# Altium schematic symbol library 13-Analog D 数模模数.SchLib: 573 symbols (part 1 of 6) (continued)
## AD5622
designator IC?
2.7 V to 5.5 V, <100 µA, 12-Bit nanoDAC, With I2C®-Compatible Interface
pins: 1 ADDR (in), 2 SCL (in), 3 SDA (in), 4 VDD (power), 5 GND (power), 6 VOUT (out)

## AD5627R
designator IC?
Dual, 12-/14-/16-Bit nanoDACs® with 5 ppm/°C On-Chip Reference, I2C Interface
pins: 1 VOUTA (out), 2 VOUTB (power), 3 GND (power), 4 ~{LDAC} (in), 5 ~{CLR} (in), 6 ADDR (in), 7 SCL (io), 8 SDA (io), 9 VDD (power), 10 VREFIN/VREFOUT (io)
text: VREFIN; VREFOUT

## AD5641
designator IC?
2.7 V to 5.5 V, <100 µA, 14-Bit nanoDAC, SPI Interface
pins: 1 ~{SYNC} (in), 2 SCLK (in), 3 SDIN (in), 4 VDD (power), 5 GND (power), 6 VOUT (out)

## AD5662
designator IC?
2.7V to 5.5V, 250uA, Rail-to-Rail Output 16-Bit nanoDAC
pins: 1 VDD (power), 2 VREF (in), 3 VFB (in), 4 VOUT (out), 5 ~{SYNC} (in), 6 SCLK (in), 7 DIN (in), 8 GND (power)

## AD5666
designator IC?
Quad, 16-Bit DAC with 5 ppm/°C On-Chip Reference
pins: 1 ~{LDAC} (in), 2 ~{SYNC} (in), 3 VDD (power), 4 VOUTA (out), 5 VOUTC (out), 6 POR (in), 7 VREFIN/VREFOUT (io), 8 SDO (out), 9 ~{CLR} (in), 10 VOUTD (out), 11 VOUTB (out), 12 GND (power), 13 DIN (in), 14 SCLK (in)
text: VREFIN; VREFOUT

## AD5754R
designator IC?
Complete, Quad, 16-Bit Serial Input Unipolar/Bipolar Voltage Outputs DAC
pins: 1 AVSS (power), 2 NC, 3 VOUTA (out), 4 VOUTB (out), 5 BIN/~{2SCOMP} (in), 6 NC, 7 ~{SYNC} (in), 8 SCLK (in), 9 SDIN (in), 10 ~{LDAC} (in), 11 ~{CLR} (in), 12 NC, 13 NC, 14 DVCC (power), 15 GND (power), 16 SDO (out), 17 REFIN/REFOUT (io), 18 DAC_GND (power), 19 DAC_GND (power), 20 SIG_GND (power), 21 SIG_GND (power), 22 VOUTD (out), 23 VOUTC (out), 24 AVDD (power), 25 EP (power)
text: VREFIN/; VREFOUT

## AD5764R
designator IC?
Complete Quad, 16-Bit, High Accuracy, Serial Input, Bipolar Voltage Output DAC
pins: 1 ~{SYNC} (in), 2 SCLK (in), 3 SDIN (in), 4 SDO (out), 5 ~{CLR} (in), 6 ~{LDAC} (in), 7 D0 (io), 8 D1 (io), 9 ~{RSROUT} (out), 10 ~{RSTIN} (in), 11 DGND (power), 12 DVCC (power), 13 AVDD (power), 14 PGND (power), 15 AVSS (power), 16 ISCC (power), 17 AGNDD (power), 18 VOUTD (out), 19 VOUTC (out), 20 AGNDC (power), 21 AGNDB (power), 22 VOUTB (out), 23 VOUTA (out), 24 AGNDA (power), 25 REFAB (in), 26 REFCD (in), 27 REFOUT (out), 28 REFGND (in), 29 TEMP (out), 30 AVSS (power), 31 AVDD (power), 32 BIN/~{2sCOMP} (power)

## AD5780
designator IC?
System Ready, 18-Bit ±1 LSB INL, Voltage Output DAC
pins: 1 VOUT (out), 2 VREFP (in), 3 VDD (power), 4 ~{RESET} (in), 5 VDD (power), 6 ~{CLR} (in), 7 ~{LDAC} (in), 8 VCC (power), 9 IOVCC (power), 10 DNC, 11 SDO (out), 12 SDIN (in), 13 SCLK (in), 14 ~{SYNC} (in), 15 DGND (power), 16 VREFN (in), 17 VSS (power), 18 VSS (power), 19 AGND (power), 20 RFB (in), 21 DNC, 22 DNC, 23 DNC, 24 INV (out), 25 EP (power)

## AD5791
designator IC?
1 ppm 20-Bit, ±1 LSB INL, Voltage Output DAC
pins: 1 INV (out), 2 VOUT (out), 3 VREFPS (out), 4 VREFPF (in), 5 VDD (power), 6 ~{RESET} (in), 7 ~{CLR} (in), 8 ~{LDAC} (in), 9 VCC (power), 10 IOVCC (power), 11 SDO (out), 12 SDIN (in), 13 SCLK (in), 14 ~{SYNC} (in), 15 DGND (in), 16 VREFNF (in), 17 VREFNS (out), 18 VSS (in), 19 AGND (power), 20 RFB (in)

## AD7194
designator IC?
8-Channel, 4.8 kHz, Ultralow Noise, 24-Bit Sigma-Delta ADC with PGA
pins: 1 AIN1/P3 (io), 2 AIN2/P2 (io), 3 AIN3/P1/REFIN2(+) (io), 4 AIN4/P0/REFIN2(-) (io), 5 AINCOM (power), 6 AGND (power), 7 AIN5 (in), 8 AIN6 (in), 9 AIN7 (in), 10 AIN8 (in), 11 AIN9 (in), 12 AIN10 (in), 13 AIN11 (in), 14 AIN12 (in), 15 AIN13 (in), 16 AIN14 (in), 17 REFIN1(+) (in), 18 REFIN1(-) (in), 19 AIN15 (in), 20 AIN16 (in), 21 AGND (power), 22 DGND (power), 23 AVDD (power), 24 DVDD (power), 25 ~{SYNC} (in), 26 NC, 27 DOUT/~{RDY} (out), 28 DIN (in), 29 MCLK1 (in), 30 MCLK2 (in), 31 SCLK (in), 32 ~{CS} (in), 33 EP (in)

## AD7224KN
designator IC?
LC2MOS 8-Bit DAC with Output Amplifiers
pins: 1 VSS (power), 2 VOUT (out), 3 VREF (in), 4 AGND (power), 5 DGND (power), 6 DB7 (in), 7 DB6 (in), 8 DB5 (in), 9 DB4 (in), 10 DB3 (in), 11 DB2 (in), 12 DB1 (in), 13 DB0 (in), 14 ~{CS} (in), 15 ~{WR} (in), 16 ~{LDAC} (in), 17 ~{RESET} (in), 18 VDD (power)

## AD7477AARM
designator IC?
2.35V to 5.25V, 1 MSPS, 10-Bit ADC  (INL: ±0.5 LSB Max)
pins: 1 VDD (power), 2 SDATA (out), 3 ~{CS} (in), 4 NC, 5 NC, 6 SCLK (in), 7 GND (power), 8 VIN (in)

## AD7490BRUZ
designator IC?
16-Channel, 1 MSPS, 12-Bit ADC With Sequencer
pins: 1 VIN11 (in), 2 VIN10 (in), 3 VIN9 (in), 4 NC, 5 VIN8 (in), 6 VIN7 (in), 7 VIN6 (in), 8 VIN5 (in), 9 VIN4 (in), 10 VIN3 (in), 11 VIN2 (in), 12 VIN1 (in), 13 VIN0 (in), 14 AGND (power), 15 DOUT (out), 16 SCLK (in), 17 VDRIVE (power), 18 NC, 19 DIN (in), 20 ~{CS} (in), 21 AGND (power), 22 VDD (power), 23 REFIN (in), 24 AGND (power), 25 VIN15 (in), 26 VIN14 (in), 27 VIN13 (in), 28 VIN12 (in)

## AD7541AKNZ
designator IC?
12-Bit Monolithic Multiplying DAC
pins: 1 OUT1 (out), 2 OUT2 (out), 3 GND (power), 4 BIT1(MSB) (in), 5 BIT2 (in), 6 BIT3 (in), 7 BIT4 (in), 8 BIT5 (in), 9 BIT6 (in), 10 BIT7 (in), 11 BIT8 (in), 12 BIT9 (in), 13 BIT10 (in), 14 BIT11 (in), 15 BIT12(LSB) (in), 16 VDD (power), 17 VREFIN (in), 18 RFB (in)

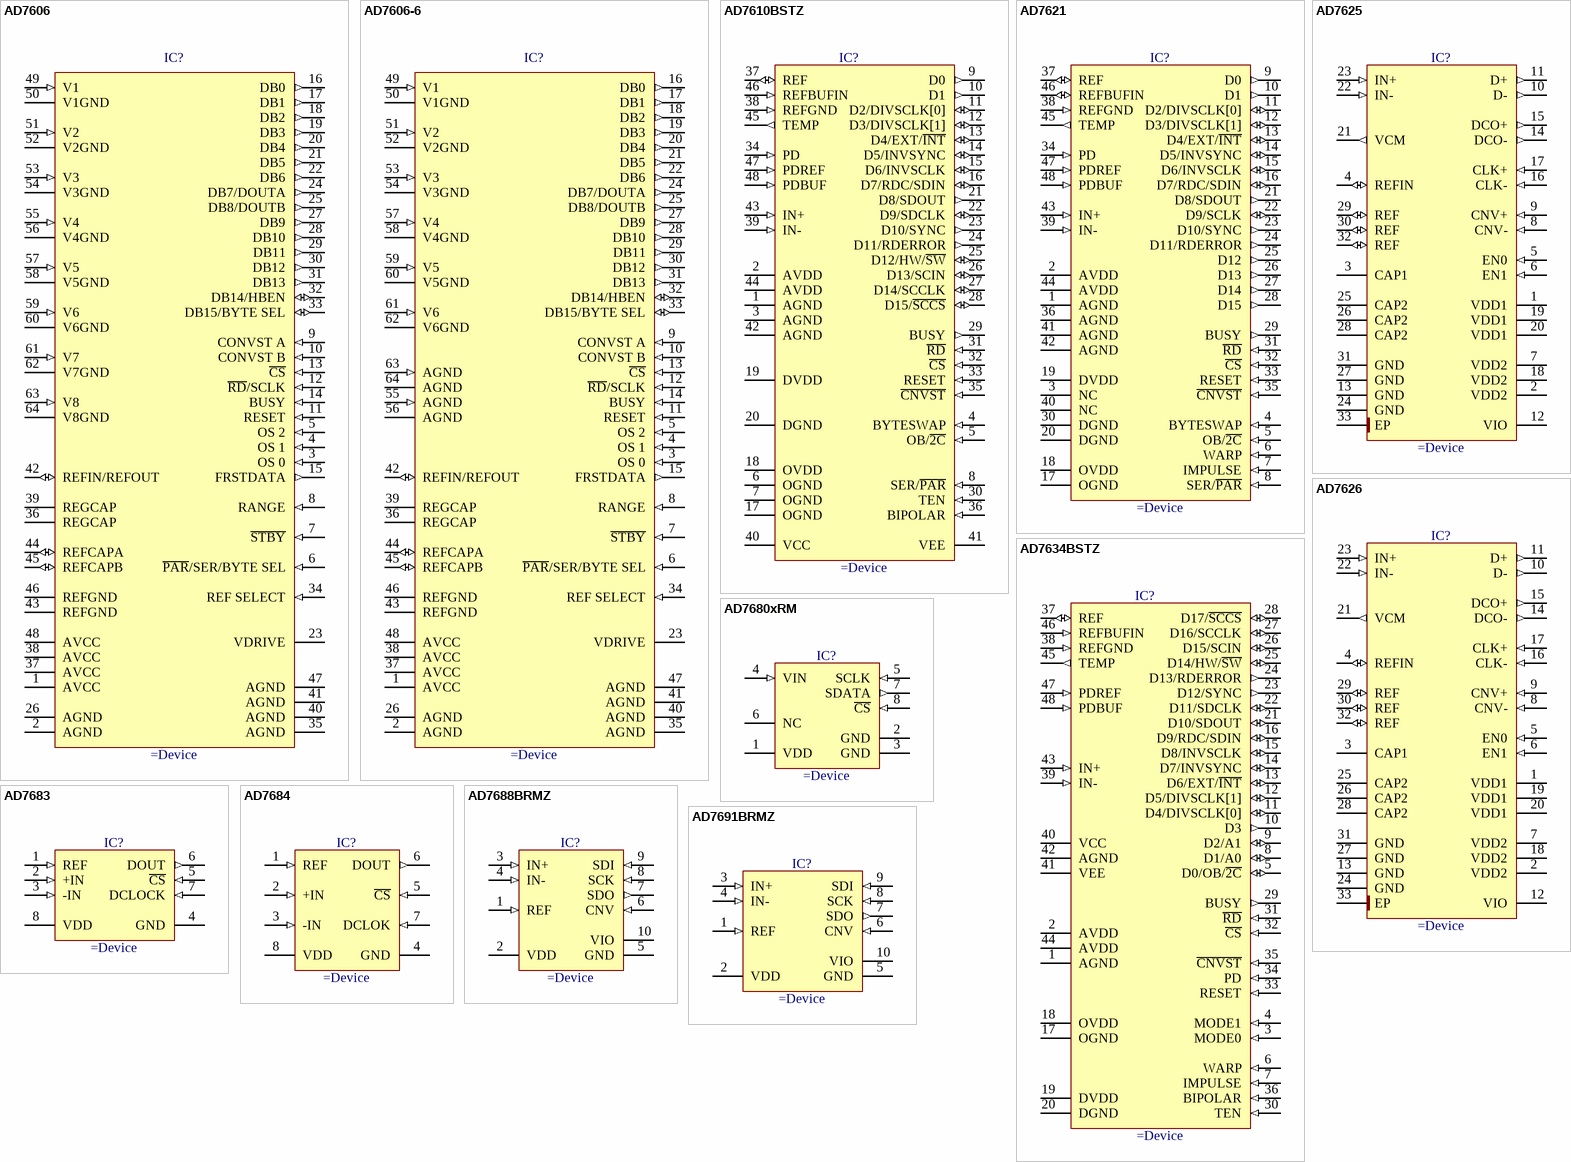
[diagram p4: symbols AD7606 to AD7691BRMZ]

## AD7606
designator IC?
8-Channel DAS with 16-Bit, Bipolar Simultaneous Sampling ADC
pins: 1 AVCC (power), 2 AGND (power), 3 OS 0 (in), 4 OS 1 (in), 5 OS 2 (in), 6 ~{PAR}/SER/BYTE SEL (in), 7 ~{STBY} (in), 8 RANGE (in), 9 CONVST A (in), 10 CONVST B (in), 11 RESET (in), 12 ~{RD}/SCLK (in), 13 ~{CS} (in), 14 BUSY (in), 15 FRSTDATA (out), 16 DB0 (out), 17 DB1 (out), 18 DB2 (out), 19 DB3 (out), 20 DB4 (out), 21 DB5 (out), 22 DB6 (out), 23 VDRIVE (power), 24 DB7/DOUTA (out), 25 DB8/DOUTB (out), 26 AGND (power), 27 DB9 (out), 28 DB10 (out), 29 DB11 (out), 30 DB12 (out), 31 DB13 (out), 32 DB14/HBEN (io), 33 DB15/BYTE SEL (io), 34 REF SELECT (in), 35 AGND (power), 36 REGCAP (power), 37 AVCC (power), 38 AVCC (power), 39 REGCAP (power), 40 AGND (power), 41 AGND (power), 42 REFIN/REFOUT (io), 43 REFGND (power), 44 REFCAPA (io), 45 REFCAPB (io), 46 REFGND (power), 47 AGND (power), 48 AVCC (power), 49 V1 (in), 50 V1GND (power), 51 V2 (in), 52 V2GND (power), 53 V3 (in), 54 V3GND (power), 55 V4 (in), 56 V4GND (power), 57 V5 (in), 58 V5GND (power), 59 V6 (in), 60 V6GND (power), 61 V7 (in), 62 V7GND (power), 63 V8 (in), 64 V8GND (power)

## AD7606-6
designator IC?
6-Channel DAS with 16-Bit, Bipolar Simultaneous Sampling ADC
pins: 1 AVCC (power), 2 AGND (power), 3 OS 0 (in), 4 OS 1 (in), 5 OS 2 (in), 6 ~{PAR}/SER/BYTE SEL (in), 7 ~{STBY} (in), 8 RANGE (in), 9 CONVST A (in), 10 CONVST B (in), 11 RESET (in), 12 ~{RD}/SCLK (in), 13 ~{CS} (in), 14 BUSY (in), 15 FRSTDATA (out), 16 DB0 (out), 17 DB1 (out), 18 DB2 (out), 19 DB3 (out), 20 DB4 (out), 21 DB5 (out), 22 DB6 (out), 23 VDRIVE (power), 24 DB7/DOUTA (out), 25 DB8/DOUTB (out), 26 AGND (power), 27 DB9 (out), 28 DB10 (out), 29 DB11 (out), 30 DB12 (out), 31 DB13 (out), 32 DB14/HBEN (io), 33 DB15/BYTE SEL (io), 34 REF SELECT (in), 35 AGND (power), 36 REGCAP (power), 37 AVCC (power), 38 AVCC (power), 39 REGCAP (power), 40 AGND (power), 41 AGND (power), 42 REFIN/REFOUT (io), 43 REFGND (power), 44 REFCAPA (io), 45 REFCAPB (io), 46 REFGND (power), 47 AGND (power), 48 AVCC (power), 49 V1 (in), 50 V1GND (power), 51 V2 (in), 52 V2GND (power), 53 V3 (in), 54 V3GND (power), 55 AGND (in), 56 AGND (power), 57 V4 (in), 58 V4GND (power), 59 V5 (in), 60 V5GND (power), 61 V6 (in), 62 V6GND (power), 63 AGND (in), 64 AGND (power)

## AD7610BSTZ
designator IC?
16-Bit, 250 kSPS, Unipolar/Bipolar Programmable Input PulSAR® ADC
pins: 1 AGND (power), 2 AVDD (power), 3 AGND (power), 4 BYTESWAP (in), 5 OB/~{2C} (in), 6 OGND (power), 7 OGND (power), 8 SER/~{PAR} (in), 9 D0 (out), 10 D1 (out), 11 D2/DIVSCLK[0] (io), 12 D3/DIVSCLK[1] (io), 13 D4/EXT/~{INT} (io), 14 D5/INVSYNC (io), 15 D6/INVSCLK (io), 16 D7/RDC/SDIN (io), 17 OGND (power), 18 OVDD (power), 19 DVDD (power), 20 DGND (power), 21 D8/SDOUT (out), 22 D9/SDCLK (io), 23 D10/SYNC (out), 24 D11/RDERROR (out), 25 D12/HW/~{SW} (io), 26 D13/SCIN (io), 27 D14/SCCLK (io), 28 D15/~{SCCS} (io), 29 BUSY (out), 30 TEN (in), 31 ~{RD} (in), 32 ~{CS} (in), 33 RESET (in), 34 PD (in), 35 ~{CNVST} (in), 36 BIPOLAR (in), 37 REF (io), 38 REFGND (in), 39 IN- (in), 40 VCC (power), 41 VEE (power), 42 AGND (power), 43 IN+ (in), 44 AVDD (power), 45 TEMP (out), 46 REFBUFIN (in), 47 PDREF (in), 48 PDBUF (in)

## AD7621
designator IC?
16-Bit, 2 LSB INL, 3 MSPS PulSAR® ADC
pins: 1 AGND (power), 2 AVDD (power), 3 NC, 4 BYTESWAP (in), 5 OB/~{2C} (in), 6 WARP (in), 7 IMPULSE (in), 8 SER/~{PAR} (in), 9 D0 (out), 10 D1 (out), 11 D2/DIVSCLK[0] (io), 12 D3/DIVSCLK[1] (io), 13 D4/EXT/~{INT} (io), 14 D5/INVSYNC (io), 15 D6/INVSCLK (io), 16 D7/RDC/SDIN (io), 17 OGND (power), 18 OVDD (power), 19 DVDD (power), 20 DGND (power), 21 D8/SDOUT (out), 22 D9/SCLK (io), 23 D10/SYNC (out), 24 D11/RDERROR (out), 25 D12 (out), 26 D13 (out), 27 D14 (out), 28 D15 (out), 29 BUSY (out), 30 DGND (power), 31 ~{RD} (in), 32 ~{CS} (in), 33 RESET (in), 34 PD (in), 35 ~{CNVST} (in), 36 AGND (power), 37 REF (io), 38 REFGND (in), 39 IN- (in), 40 NC, 41 AGND (power), 42 AGND (power), 43 IN+ (in), 44 AVDD (power), 45 TEMP (out), 46 REFBUFIN (io), 47 PDREF (in), 48 PDBUF (in)

## AD7625
designator IC?
16-Bit, 6 MSPS, PulSAR Differential ADC
pins: 1 VDD1 (power), 2 VDD2 (power), 3 CAP1, 4 REFIN (io), 5 EN0 (in), 6 EN1 (in), 7 VDD2 (power), 8 CNV- (in), 9 CNV+ (in), 10 D- (out), 11 D+ (out), 12 VIO (power), 13 GND (power), 14 DCO- (out), 15 DCO+ (out), 16 CLK- (in), 17 CLK+ (in), 18 VDD2 (power), 19 VDD1 (power), 20 VDD1 (power), 21 VCM (out), 22 IN- (in), 23 IN+ (in), 24 GND (power), 25 CAP2, 26 CAP2, 27 GND (power), 28 CAP2, 29 REF (io), 30 REF (io), 31 GND (power), 32 REF (io), 33 EP (power)

## AD7626
designator IC?
16-Bit, 10 MSPS, PulSAR Differential ADC
pins: 1 VDD1 (power), 2 VDD2 (power), 3 CAP1, 4 REFIN (io), 5 EN0 (in), 6 EN1 (in), 7 VDD2 (power), 8 CNV- (in), 9 CNV+ (in), 10 D- (out), 11 D+ (out), 12 VIO (power), 13 GND (power), 14 DCO- (out), 15 DCO+ (out), 16 CLK- (in), 17 CLK+ (in), 18 VDD2 (power), 19 VDD1 (power), 20 VDD1 (power), 21 VCM (out), 22 IN- (in), 23 IN+ (in), 24 GND (power), 25 CAP2, 26 CAP2, 27 GND (power), 28 CAP2, 29 REF (io), 30 REF (io), 31 GND (power), 32 REF (io), 33 EP (power)

## AD7634BSTZ
designator IC?
18-Bit, 670 kSPS, Differential Programmable Input PulSAR® ADC
pins: 1 AGND (power), 2 AVDD (power), 3 MODE0 (in), 4 MODE1 (in), 5 D0/OB/~{2C} (io), 6 WARP (in), 7 IMPULSE (in), 8 D1/A0 (io), 9 D2/A1 (io), 10 D3 (out), 11 D4/DIVSCLK[0] (io), 12 D5/DIVSCLK[1] (io), 13 D6/EXT/~{INT} (io), 14 D7/INVSYNC (io), 15 D8/INVSCLK (io), 16 D9/RDC/SDIN (io), 17 OGND (power), 18 OVDD (power), 19 DVDD (power), 20 DGND (power), 21 D10/SDOUT (io), 22 D11/SDCLK (io), 23 D12/SYNC (out), 24 D13/RDERROR (out), 25 D14/HW/~{SW} (io), 26 D15/SCIN (io), 27 D16/SCCLK (io), 28 D17/~{SCCS} (io), 29 BUSY (out), 30 TEN (in), 31 ~{RD} (in), 32 ~{CS} (in), 33 RESET (in), 34 PD (in), 35 ~{CNVST} (in), 36 BIPOLAR (in), 37 REF (io), 38 REFGND (in), 39 IN- (in), 40 VCC (power), 41 VEE (power), 42 AGND (power), 43 IN+ (in), 44 AVDD (power), 45 TEMP (out), 46 REFBUFIN (in), 47 PDREF (in), 48 PDBUF (in)

## AD7680xRM
designator IC?
3mW, 100kSPS, 16-Bit ADC
pins: 1 VDD (power), 2 GND (power), 3 GND (power), 4 VIN (in), 5 SCLK (in), 6 NC, 7 SDATA (out), 8 ~{CS} (in)

## AD7683
designator IC?
16-Bit, 100 kSPS, Single-Ended,  PulSAR Analog-To-Digital Converter
pins: 1 REF (in), 2 +IN (in), 3 -IN (in), 4 GND (power), 5 ~{CS} (in), 6 DOUT (out), 7 DCLOCK (in), 8 VDD (power)

## AD7684
designator IC?
16-Bit, 100 kSPS PulSAR®, Differential ADC in MSOP
pins: 1 REF (in), 2 +IN (in), 3 -IN (in), 4 GND (power), 5 ~{CS} (in), 6 DOUT (out), 7 DCLOK (in), 8 VDD (power)

## AD7688BRMZ
designator IC?
16-Bit, 1.5 LSB INL, 500 kSPS PulSAR Differential ADC
pins: 1 REF (in), 2 VDD (power), 3 IN+ (in), 4 IN- (in), 5 GND (power), 6 CNV (in), 7 SDO (out), 8 SCK (in), 9 SDI (in), 10 VIO (power)

## AD7691BRMZ
designator IC?
18-Bit, 1.5 LSB INL, 250 kSPS PulSAR Differential ADC
pins: 1 REF (in), 2 VDD (power), 3 IN+ (in), 4 IN- (in), 5 GND (power), 6 CNV (in), 7 SDO (out), 8 SCK (in), 9 SDI (in), 10 VIO (power)

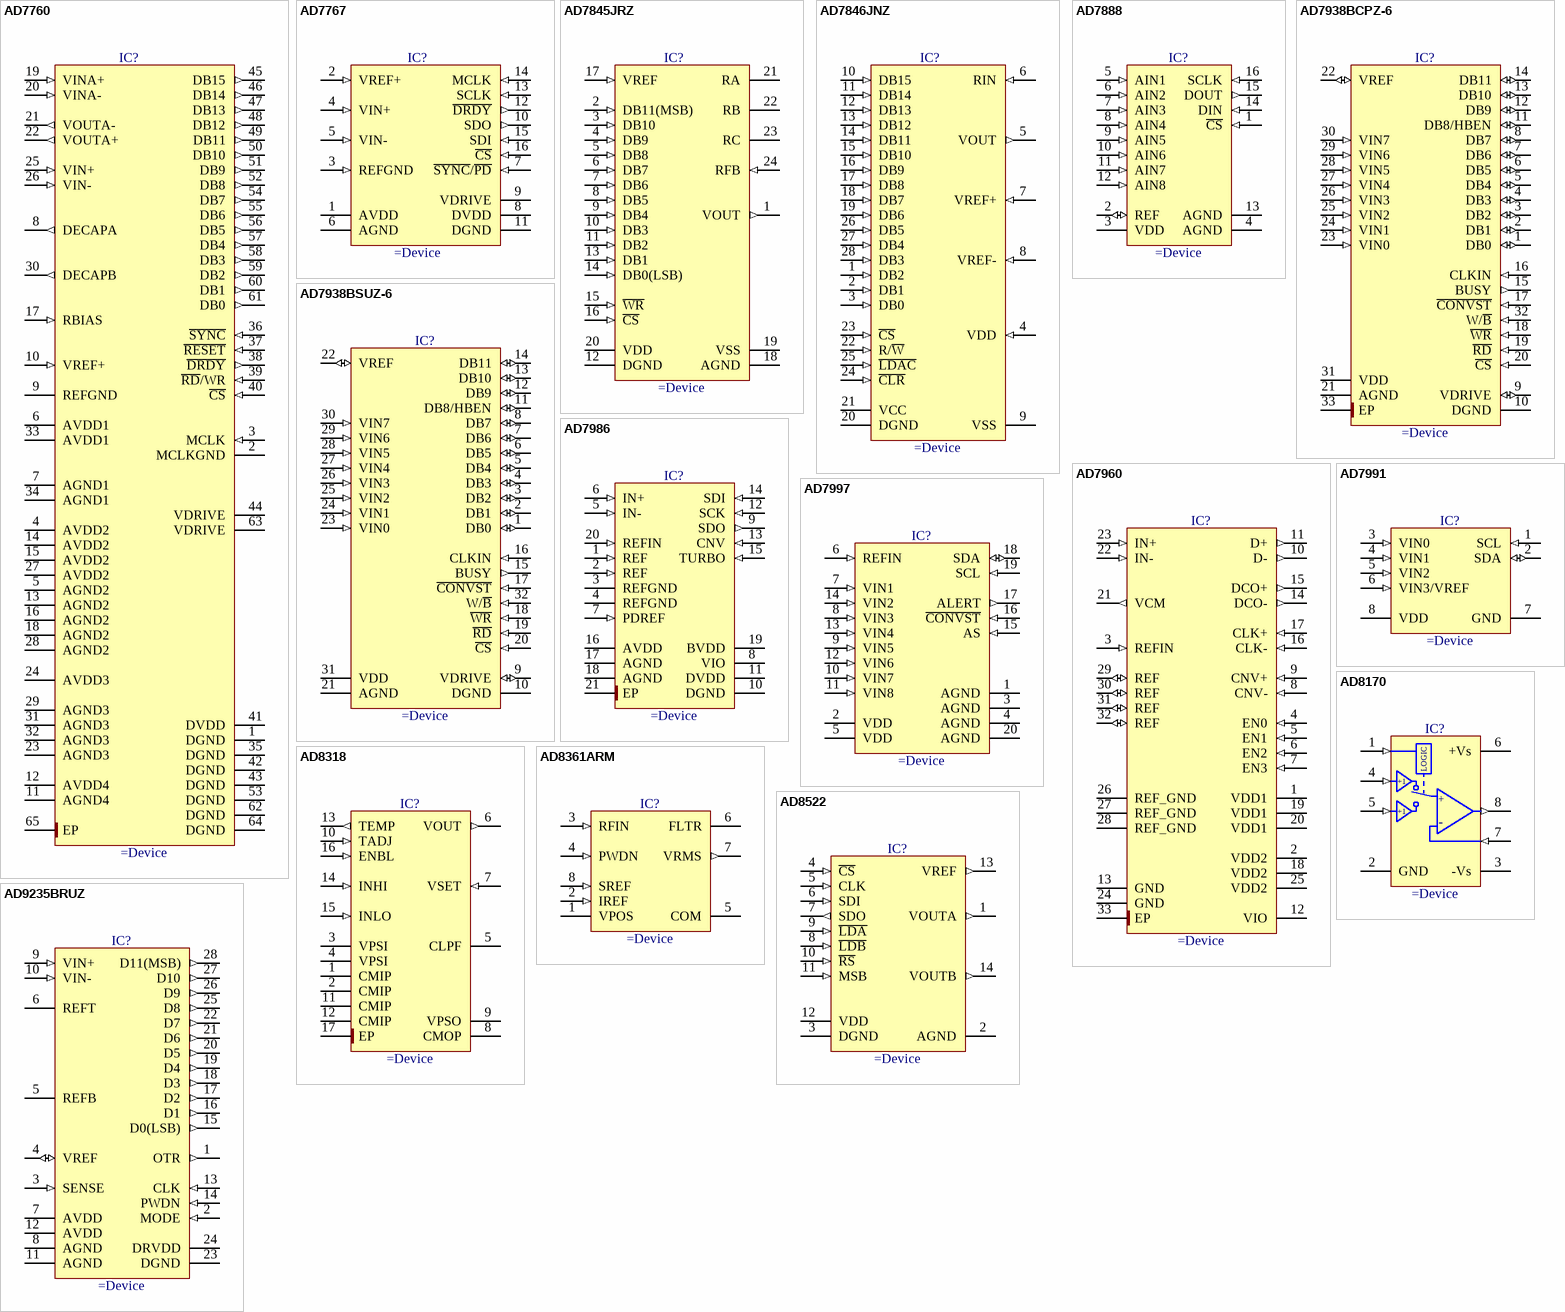
[diagram p5: symbols AD7760 to AD9235BRUZ]

## AD7760
designator IC?
2.5MSPS, 24-Bit, 100dB Sigma-Delta ADC With On-Chip Buffer
pins: 1 DGND (power), 2 MCLKGND (power), 3 MCLK (in), 4 AVDD2 (power), 5 AGND2 (power), 6 AVDD1 (power), 7 AGND1 (power), 8 DECAPA (out), 9 REFGND (power), 10 VREF+ (in), 11 AGND4 (power), 12 AVDD4 (power), 13 AGND2 (power), 14 AVDD2 (power), 15 AVDD2 (power), 16 AGND2 (power), 17 RBIAS (in), 18 AGND2 (power), 19 VINA+ (in), 20 VINA- (in), 21 VOUTA- (out), 22 VOUTA+ (out), 23 AGND3 (power), 24 AVDD3 (power), 25 VIN+ (in), 26 VIN- (in), 27 AVDD2 (power), 28 AGND2 (power), 29 AGND3 (power), 30 DECAPB (out), 31 AGND3 (power), 32 AGND3 (power), 33 AVDD1 (power), 34 AGND1 (power), 35 DGND (power), 36 ~{SYNC} (in), 37 ~{RESET} (in), 38 ~{DRDY} (out), 39 ~{RD}/WR (in), 40 ~{CS} (in), 41 DVDD (power), 42 DGND (power), 43 DGND (power), 44 VDRIVE (power), 45 DB15 (out), 46 DB14 (out), 47 DB13 (out), 48 DB12 (out), 49 DB11 (out), 50 DB10 (out), 51 DB9 (out), 52 DB8 (out), 53 DGND (power), 54 DB7 (out), 55 DB6 (out), 56 DB5 (out), 57 DB4 (out), 58 DB3 (out), 59 DB2 (out), 60 DB1 (out), 61 DB0 (out), 62 DGND (power), 63 VDRIVE (power), 64 DGND (power), 65 EP (power)

## AD7767
designator IC?
24-Bit, 8.5 mW, 109 dB, 128 kSPS ADC
pins: 1 AVDD (power), 2 VREF+ (in), 3 REFGND (in), 4 VIN+ (in), 5 VIN- (in), 6 AGND (power), 7 ~{SYNC}/~{PD} (in), 8 DVDD (power), 9 VDRIVE (power), 10 SDO (out), 11 DGND (power), 12 ~{DRDY} (out), 13 SCLK (in), 14 MCLK (in), 15 SDI (in), 16 ~{CS} (in)

## AD7845JRZ
designator IC?
LC2MOS Complete 12-Bit Multiplying DAC
pins: 1 VOUT (out), 2 DB11(MSB) (in), 3 DB10 (in), 4 DB9 (in), 5 DB8 (in), 6 DB7 (in), 7 DB6 (in), 8 DB5 (in), 9 DB4 (in), 10 DB3 (in), 11 DB2 (in), 12 DGND (power), 13 DB1 (in), 14 DB0(LSB) (in), 15 ~{WR} (in), 16 ~{CS} (in), 17 VREF (in), 18 AGND (power), 19 VSS (power), 20 VDD (power), 21 RA, 22 RB, 23 RC, 24 RFB (in)

## AD7846JNZ
designator IC?
16-Bit Voltage Output DAC
pins: 1 DB2 (in), 2 DB1 (in), 3 DB0 (in), 4 VDD (in), 5 VOUT (out), 6 RIN (in), 7 VREF+ (in), 8 VREF- (in), 9 VSS (power), 10 DB15 (in), 11 DB14 (in), 12 DB13 (in), 13 DB12 (in), 14 DB11 (in), 15 DB10 (in), 16 DB9 (in), 17 DB8 (in), 18 DB7 (in), 19 DB6 (in), 20 DGND (power), 21 VCC (power), 22 R/~{W} (in), 23 ~{CS} (in), 24 ~{CLR} (in), 25 ~{LDAC} (in), 26 DB5 (in), 27 DB4 (in), 28 DB3 (in)

## AD7888
designator IC?
2.7 V to 5.25 V, Micro Power, 8-Channel, 125 kSPS, 12-Bit ADC
pins: 1 ~{CS} (in), 2 REF (io), 3 VDD (power), 4 AGND (power), 5 AIN1 (in), 6 AIN2 (in), 7 AIN3 (in), 8 AIN4 (in), 9 AIN5 (in), 10 AIN6 (in), 11 AIN7 (in), 12 AIN8 (in), 13 AGND (power), 14 DIN (in), 15 DOUT (out), 16 SCLK (in)

## AD7938BCPZ-6
designator IC?
8-Channel, 625 kSPS, 12-Bit Parallel ADCs with a Sequencer
pins: 1 DB0 (io), 2 DB1 (io), 3 DB2 (io), 4 DB3 (io), 5 DB4 (io), 6 DB5 (io), 7 DB6 (io), 8 DB7 (io), 9 VDRIVE (io), 10 DGND (power), 11 DB8/HBEN (io), 12 DB9 (io), 13 DB10 (io), 14 DB11 (io), 15 BUSY (out), 16 CLKIN (in), 17 ~{CONVST} (in), 18 ~{WR} (in), 19 ~{RD} (in), 20 ~{CS} (in), 21 AGND (power), 22 VREF (io), 23 VIN0 (in), 24 VIN1 (in), 25 VIN2 (in), 26 VIN3 (in), 27 VIN4 (in), 28 VIN5 (in), 29 VIN6 (in), 30 VIN7 (in), 31 VDD (power), 32 W/~{B} (in), 33 EP (power)

## AD7938BSUZ-6
designator IC?
8-Channel, 625 kSPS, 12-Bit Parallel ADCs with a Sequencer
pins: 1 DB0 (io), 2 DB1 (io), 3 DB2 (io), 4 DB3 (io), 5 DB4 (io), 6 DB5 (io), 7 DB6 (io), 8 DB7 (io), 9 VDRIVE (io), 10 DGND (power), 11 DB8/HBEN (io), 12 DB9 (io), 13 DB10 (io), 14 DB11 (io), 15 BUSY (out), 16 CLKIN (in), 17 ~{CONVST} (in), 18 ~{WR} (in), 19 ~{RD} (in), 20 ~{CS} (in), 21 AGND (power), 22 VREF (io), 23 VIN0 (in), 24 VIN1 (in), 25 VIN2 (in), 26 VIN3 (in), 27 VIN4 (in), 28 VIN5 (in), 29 VIN6 (in), 30 VIN7 (in), 31 VDD (power), 32 W/~{B} (in)

## AD7960
designator IC?
18-Bit, 5 MSPS, PulSAR Differential ADC
pins: 1 VDD1 (power), 2 VDD2 (power), 3 REFIN (in), 4 EN0 (in), 5 EN1 (in), 6 EN2 (in), 7 EN3 (in), 8 CNV- (in), 9 CNV+ (in), 10 D- (out), 11 D+ (out), 12 VIO (power), 13 GND (power), 14 DCO- (out), 15 DCO+ (out), 16 CLK- (in), 17 CLK+ (in), 18 VDD2 (power), 19 VDD1 (power), 20 VDD1 (power), 21 VCM (out), 22 IN- (in), 23 IN+ (in), 24 GND (power), 25 VDD2 (power), 26 REF_GND (power), 27 REF_GND (power), 28 REF_GND (power), 29 REF (io), 30 REF (io), 31 REF (io), 32 REF (io), 33 EP (power)

## AD7986
designator IC?
18-Bit, 2MSPS PulSAR 15mW ADC
pins: 1 REF (in), 2 REF (in), 3 REFGND (power), 4 REFGND (power), 5 IN- (in), 6 IN+ (in), 7 PDREF (in), 8 VIO (power), 9 SDO (out), 10 DGND (power), 11 DVDD (power), 12 SCK (in), 13 CNV (in), 14 SDI (in), 15 TURBO (in), 16 AVDD (power), 17 AGND (power), 18 AGND (power), 19 BVDD (power), 20 REFIN (in), 21 EP (power)

## AD7991
designator IC?
4-Channel, 12-Bit ADC with I2C-Compatible Interface
pins: 1 SCL (in), 2 SDA (io), 3 VIN0 (in), 4 VIN1 (in), 5 VIN2 (in), 6 VIN3/VREF (in), 7 GND (power), 8 VDD (power)

## AD7997
designator IC?
8-Channel, 10-Bit ADCs with I2C-Compatible Interface
pins: 1 AGND (power), 2 VDD (power), 3 AGND (power), 4 AGND (power), 5 VDD (power), 6 REFIN (in), 7 VIN1 (in), 8 VIN3 (in), 9 VIN5 (in), 10 VIN7 (in), 11 VIN8 (in), 12 VIN6 (in), 13 VIN4 (in), 14 VIN2 (in), 15 AS (in), 16 ~{CONVST} (in), 17 ALERT (out), 18 SDA (io), 19 SCL (in), 20 AGND (power)

## AD8170
designator IC?
250 MHz, 10 ns Switching Multiplexers With Amplifier
pins: 1 SEL (in), 2 GND (power), 3 -Vs (power), 4 IN0 (in), 5 IN1 (in), 6 +Vs (power), 7 -VIN (in), 8 VOUT (out)
text: LOGIC; +1; +; -

## AD8318
designator IC?
1MHz to 8GHz, 70 dB Logarithmic Detector/Controller
pins: 1 CMIP (power), 2 CMIP (power), 3 VPSI (power), 4 VPSI (power), 5 CLPF, 6 VOUT (out), 7 VSET (in), 8 CMOP (power), 9 VPSO (power), 10 TADJ (in), 11 CMIP (power), 12 CMIP (power), 13 TEMP (out), 14 INHI (in), 15 INLO (in), 16 ENBL (in), 17 EP (power)

## AD8361ARM
designator IC?
LF to 2.5 GHz TruPwr Detector
pins: 1 VPOS (power), 2 IREF (in), 3 RFIN (in), 4 PWDN (in), 5 COM (power), 6 FLTR, 7 VRMS (out), 8 SREF (in)

## AD8522
designator IC?
+5 Volt, Serial Input, Dual 12-Bit DAC
pins: 1 VOUTA (out), 2 AGND (power), 3 DGND (power), 4 ~{CS} (in), 5 CLK (in), 6 SDI (in), 7 SDO (out), 8 ~{LDB} (in), 9 ~{LDA} (in), 10 ~{RS} (in), 11 MSB (in), 12 VDD (power), 13 VREF (out), 14 VOUTB (out)

## AD9235BRUZ
designator IC?
12-Bit, 20/40/65 MSPS 3 V ADC
pins: 1 OTR (out), 2 MODE (in), 3 SENSE (in), 4 VREF (io), 5 REFB, 6 REFT, 7 AVDD (power), 8 AGND (power), 9 VIN+ (in), 10 VIN- (in), 11 AGND (power), 12 AVDD (power), 13 CLK (in), 14 PWDN (in), 15 D0(LSB) (out), 16 D1 (out), 17 D2 (out), 18 D3 (out), 19 D4 (out), 20 D5 (out), 21 D6 (out), 22 D7 (out), 23 DGND (power), 24 DRVDD (power), 25 D8 (out), 26 D9 (out), 27 D10 (out), 28 D11(MSB) (out)

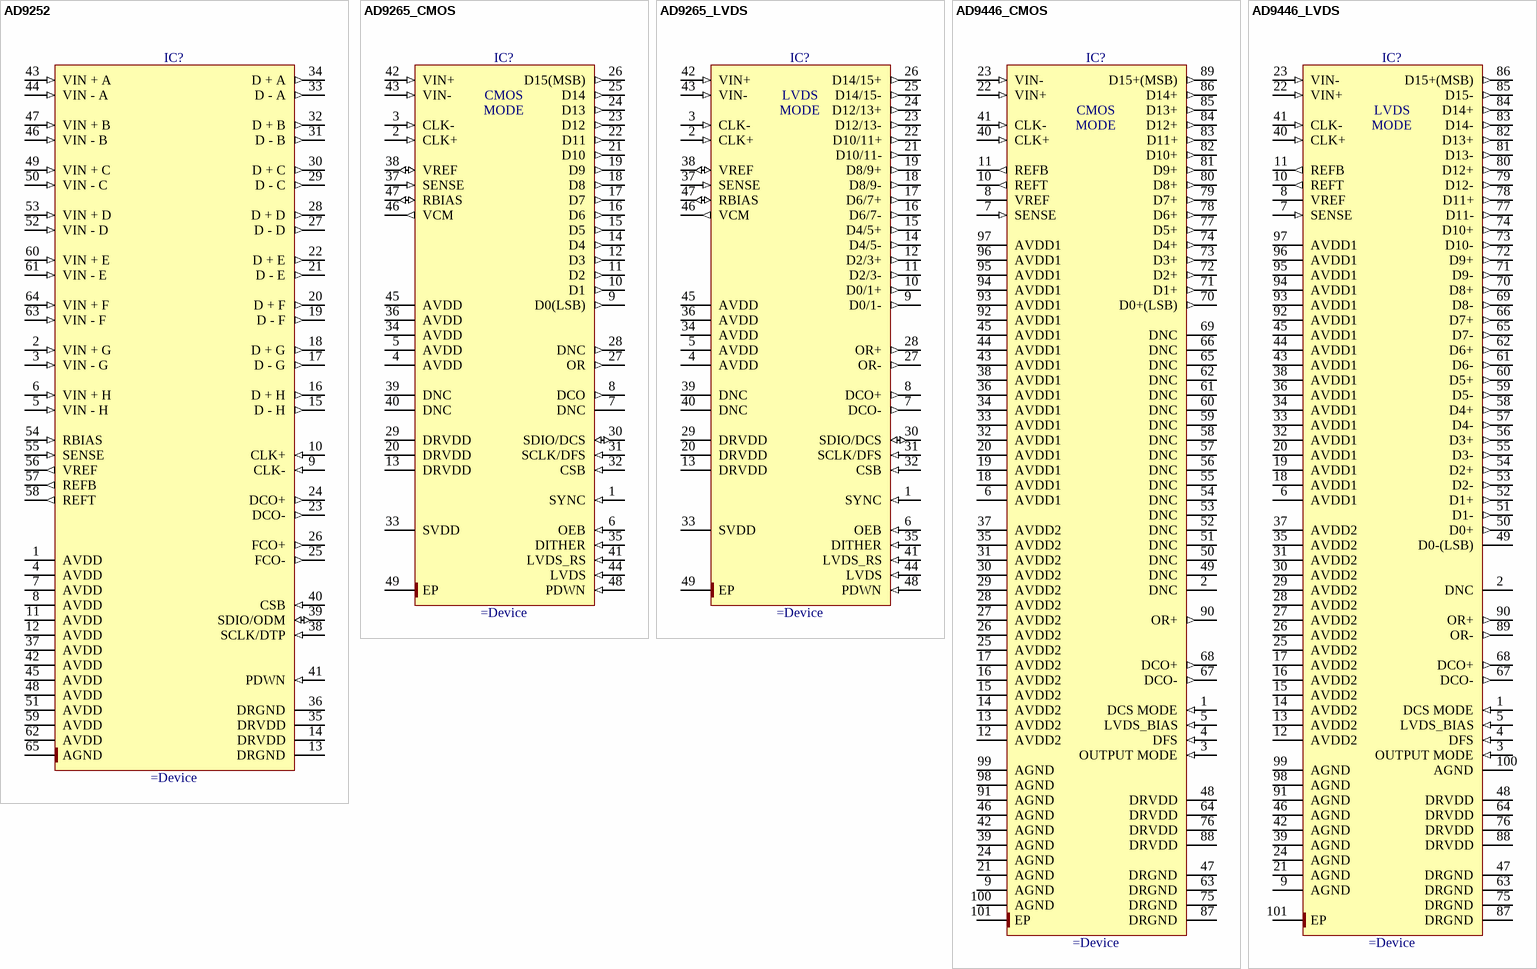
[diagram p6: symbols AD9252 to AD9446_LVDS]

## AD9252
designator IC?
Octal, 14-Bit, 50 MSPS, Serial LVDS, 1.8 V Analog-to-Digital Converter
pins: 1 AVDD (power), 2 VIN + G (in), 3 VIN - G (in), 4 AVDD (power), 5 VIN - H (in), 6 VIN + H (in), 7 AVDD (power), 8 AVDD (power), 9 CLK- (in), 10 CLK+ (in), 11 AVDD (power), 12 AVDD (power), 13 DRGND (power), 14 DRVDD (power), 15 D - H (out), 16 D + H (out), 17 D - G (out), 18 D + G (out), 19 D - F (out), 20 D + F (out), 21 D - E (out), 22 D + E (out), 23 DCO- (out), 24 DCO+ (out), 25 FCO- (out), 26 FCO+ (out), 27 D - D (out), 28 D + D (out), 29 D - C (out), 30 D + C (out), 31 D - B (out), 32 D + B (out), 33 D - A (out), 34 D + A (out), 35 DRVDD (power), 36 DRGND (power), 37 AVDD (power), 38 SCLK/DTP (in), 39 SDIO/ODM (io), 40 CSB (in), 41 PDWN (in), 42 AVDD (power), 43 VIN + A (in), 44 VIN - A (in), 45 AVDD (power), 46 VIN - B (in), 47 VIN + B (in), 48 AVDD (power), 49 VIN + C (in), 50 VIN - C (in), 51 AVDD (power), 52 VIN - D (in), 53 VIN + D (in), 54 RBIAS (in), 55 SENSE (in), 56 VREF (out), 57 REFB (out), 58 REFT (out), 59 AVDD (power), 60 VIN + E (in), 61 VIN - E (in), 62 AVDD (power), 63 VIN - F (in), 64 VIN + F (in), 65 AGND (power)

## AD9265_CMOS
designator IC?
16-Bit, 125 MSPS, 1.8 V Analog-to-Digital Converter (CMOS Mode)
pins: 1 SYNC (in), 2 CLK+ (in), 3 CLK- (in), 4 AVDD (power), 5 AVDD (power), 6 OEB (in), 7 DNC, 8 DCO (out), 9 D0(LSB) (out), 10 D1 (out), 11 D2 (out), 12 D3 (out), 13 DRVDD (power), 14 D4 (out), 15 D5 (out), 16 D6 (out), 17 D7 (out), 18 D8 (out), 19 D9 (out), 20 DRVDD (power), 21 D10 (out), 22 D11 (out), 23 D12 (out), 24 D13 (out), 25 D14 (out), 26 D15(MSB) (out), 27 OR (out), 28 DNC (out), 29 DRVDD (power), 30 SDIO/DCS (io), 31 SCLK/DFS (in), 32 CSB (in), 33 SVDD (power), 34 AVDD (power), 35 DITHER (in), 36 AVDD (power), 37 SENSE (in), 38 VREF (io), 39 DNC, 40 DNC, 41 LVDS_RS (in), 42 VIN+ (in), 43 VIN- (in), 44 LVDS (in), 45 AVDD (power), 46 VCM (out), 47 RBIAS (io), 48 PDWN (in), 49 EP (power)
text: CMOS; MODE

## AD9265_LVDS
designator IC?
16-Bit, 125 MSPS, 1.8 V Analog-to-Digital Converter (LVDS Mode)
pins: 1 SYNC (in), 2 CLK+ (in), 3 CLK- (in), 4 AVDD (power), 5 AVDD (power), 6 OEB (in), 7 DCO- (out), 8 DCO+ (out), 9 D0/1- (out), 10 D0/1+ (out), 11 D2/3- (out), 12 D2/3+ (out), 13 DRVDD (power), 14 D4/5- (out), 15 D4/5+ (out), 16 D6/7- (out), 17 D6/7+ (out), 18 D8/9- (out), 19 D8/9+ (out), 20 DRVDD (power), 21 D10/11- (out), 22 D10/11+ (out), 23 D12/13- (out), 24 D12/13+ (out), 25 D14/15- (out), 26 D14/15+ (out), 27 OR- (out), 28 OR+ (out), 29 DRVDD (power), 30 SDIO/DCS (io), 31 SCLK/DFS (in), 32 CSB (in), 33 SVDD (power), 34 AVDD (power), 35 DITHER (in), 36 AVDD (power), 37 SENSE (in), 38 VREF (io), 39 DNC, 40 DNC, 41 LVDS_RS (in), 42 VIN+ (in), 43 VIN- (in), 44 LVDS (in), 45 AVDD (power), 46 VCM (out), 47 RBIAS (io), 48 PDWN (in), 49 EP (power)
text: MODE

## AD9446_CMOS
designator IC?
16-Bit, 80/100 MSPS ADC (CMOS Mode)
pins: 1 DCS MODE (in), 2 DNC, 3 OUTPUT MODE (in), 4 DFS (in), 5 LVDS_BIAS (in), 6 AVDD1 (power), 7 SENSE (in), 8 VREF, 9 AGND (power), 10 REFT (out), 11 REFB (out), 12 AVDD2 (power), 13 AVDD2 (power), 14 AVDD2 (power), 15 AVDD2 (power), 16 AVDD2 (power), 17 AVDD2 (power), 18 AVDD1 (power), 19 AVDD1 (power), 20 AVDD1 (power), 21 AGND (power), 22 VIN+ (in), 23 VIN- (in), 24 AGND (power), 25 AVDD2 (power), 26 AVDD2 (power), 27 AVDD2 (power), 28 AVDD2 (power), 29 AVDD2 (power), 30 AVDD2 (power), 31 AVDD2 (power), 32 AVDD1 (power), 33 AVDD1 (power), 34 AVDD1 (power), 35 AVDD2 (power), 36 AVDD1 (power), 37 AVDD2 (power), 38 AVDD1 (power), 39 AGND (power), 40 CLK+ (in), 41 CLK- (in), 42 AGND (power), 43 AVDD1 (power), 44 AVDD1 (power), 45 AVDD1 (power), 46 AGND (power), 47 DRGND (power), 48 DRVDD (power), 49 DNC, 50 DNC, 51 DNC, 52 DNC, 53 DNC, 54 DNC, 55 DNC, 56 DNC, 57 DNC, 58 DNC, 59 DNC, 60 DNC, 61 DNC, 62 DNC, 63 DRGND (power), 64 DRVDD (power), 65 DNC, 66 DNC, 67 DCO- (out), 68 DCO+ (out), 69 DNC, 70 D0+(LSB) (out), 71 D1+ (out), 72 D2+ (out), 73 D3+ (out), 74 D4+ (out), 75 DRGND (power), 76 DRVDD (power), 77 D5+ (out), 78 D6+ (out), 79 D7+ (out), 80 D8+ (out), 81 D9+ (out), 82 D10+ (out), 83 D11+ (out), 84 D12+ (out), 85 D13+ (out), 86 D14+ (out), 87 DRGND (power), 88 DRVDD (power), 89 D15+(MSB) (out), 90 OR+ (out), 91 AGND (power), 92 AVDD1 (power), 93 AVDD1 (power), 94 AVDD1 (power), 95 AVDD1 (power), 96 AVDD1 (power), 97 AVDD1 (power), 98 AGND (power), 99 AGND (power), 100 AGND (power), 101 EP (power)
text: CMOS; MODE

## AD9446_LVDS
designator IC?
16-Bit, 80/100 MSPS ADC (LVDS Mode)
pins: 1 DCS MODE (in), 2 DNC, 3 OUTPUT MODE (in), 4 DFS (in), 5 LVDS_BIAS (in), 6 AVDD1 (power), 7 SENSE (in), 8 VREF, 9 AGND (power), 10 REFT (out), 11 REFB (out), 12 AVDD2 (power), 13 AVDD2 (power), 14 AVDD2 (power), 15 AVDD2 (power), 16 AVDD2 (power), 17 AVDD2 (power), 18 AVDD1 (power), 19 AVDD1 (power), 20 AVDD1 (power), 21 AGND (power), 22 VIN+ (in), 23 VIN- (in), 24 AGND (power), 25 AVDD2 (power), 26 AVDD2 (power), 27 AVDD2 (power), 28 AVDD2 (power), 29 AVDD2 (power), 30 AVDD2 (power), 31 AVDD2 (power), 32 AVDD1 (power), 33 AVDD1 (power), 34 AVDD1 (power), 35 AVDD2 (power), 36 AVDD1 (power), 37 AVDD2 (power), 38 AVDD1 (power), 39 AGND (power), 40 CLK+ (in), 41 CLK- (in), 42 AGND (power), 43 AVDD1 (power), 44 AVDD1 (power), 45 AVDD1 (power), 46 AGND (power), 47 DRGND (power), 48 DRVDD (power), 49 D0-(LSB) (power), 50 D0+ (out), 51 D1- (out), 52 D1+ (out), 53 D2- (out), 54 D2+ (out), 55 D3- (out), 56 D3+ (out), 57 D4- (out), 58 D4+ (out), 59 D5- (out), 60 D5+ (out), 61 D6- (out), 62 D6+ (out), 63 DRGND (power), 64 DRVDD (power), 65 D7- (out), 66 D7+ (out), 67 DCO- (out), 68 DCO+ (out), 69 D8- (out), 70 D8+ (out), 71 D9- (out), 72 D9+ (out), 73 D10- (out), 74 D10+ (out), 75 DRGND (power), 76 DRVDD (power), 77 D11- (out), 78 D11+ (out), 79 D12- (out), 80 D12+ (out), 81 D13- (out), 82 D13+ (out), 83 D14- (out), 84 D14+ (out), 85 D15- (out), 86 D15+(MSB) (out), 87 DRGND (power), 88 DRVDD (power), 89 OR- (out), 90 OR+ (out), 91 AGND (power), 92 AVDD1 (power), 93 AVDD1 (power), 94 AVDD1 (power), 95 AVDD1 (power), 96 AVDD1 (power), 97 AVDD1 (power), 98 AGND (power), 99 AGND (power), 100 AGND (power), 101 EP (power)
text: LVDS; MODE

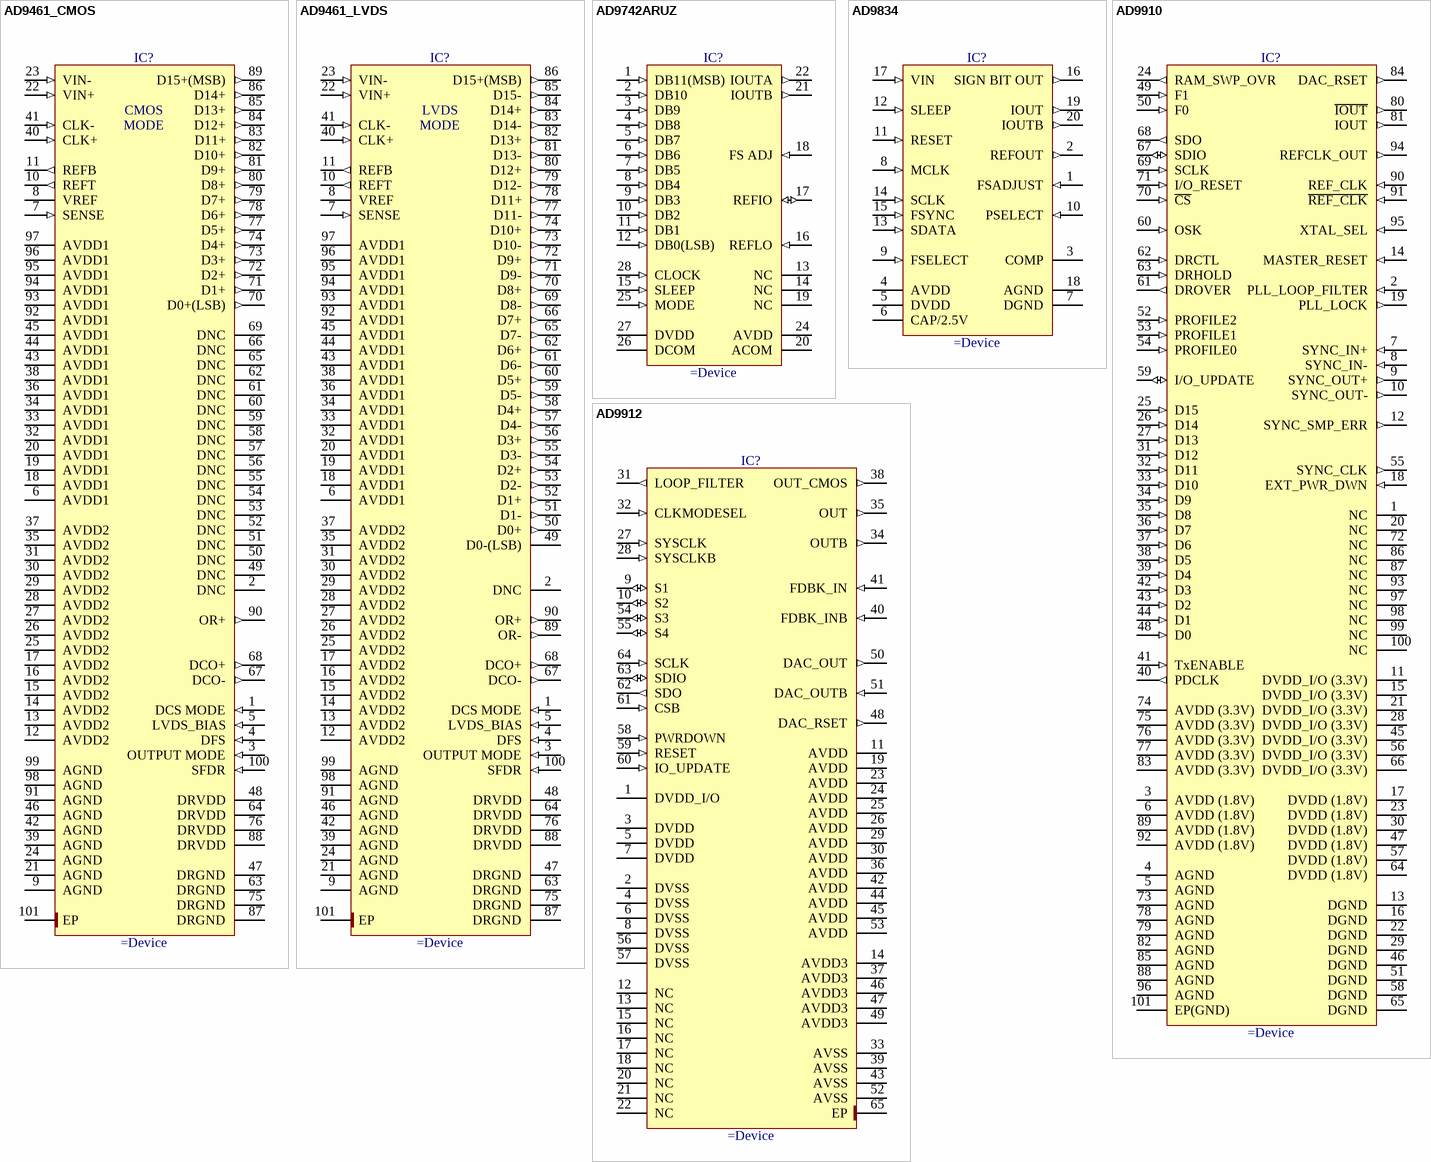
[diagram p7: symbols AD9461_CMOS to AD9912]

## AD9461_CMOS
designator IC?
16-Bit, 130 MSPS IF Sampling ADC (CMOS Mode)
pins: 1 DCS MODE (in), 2 DNC, 3 OUTPUT MODE (in), 4 DFS (in), 5 LVDS_BIAS (in), 6 AVDD1 (power), 7 SENSE (in), 8 VREF, 9 AGND (power), 10 REFT (out), 11 REFB (out), 12 AVDD2 (power), 13 AVDD2 (power), 14 AVDD2 (power), 15 AVDD2 (power), 16 AVDD2 (power), 17 AVDD2 (power), 18 AVDD1 (power), 19 AVDD1 (power), 20 AVDD1 (power), 21 AGND (power), 22 VIN+ (in), 23 VIN- (in), 24 AGND (power), 25 AVDD2 (power), 26 AVDD2 (power), 27 AVDD2 (power), 28 AVDD2 (power), 29 AVDD2 (power), 30 AVDD2 (power), 31 AVDD2 (power), 32 AVDD1 (power), 33 AVDD1 (power), 34 AVDD1 (power), 35 AVDD2 (power), 36 AVDD1 (power), 37 AVDD2 (power), 38 AVDD1 (power), 39 AGND (power), 40 CLK+ (in), 41 CLK- (in), 42 AGND (power), 43 AVDD1 (power), 44 AVDD1 (power), 45 AVDD1 (power), 46 AGND (power), 47 DRGND (power), 48 DRVDD (power), 49 DNC, 50 DNC, 51 DNC, 52 DNC, 53 DNC, 54 DNC, 55 DNC, 56 DNC, 57 DNC, 58 DNC, 59 DNC, 60 DNC, 61 DNC, 62 DNC, 63 DRGND (power), 64 DRVDD (power), 65 DNC, 66 DNC, 67 DCO- (out), 68 DCO+ (out), 69 DNC, 70 D0+(LSB) (out), 71 D1+ (out), 72 D2+ (out), 73 D3+ (out), 74 D4+ (out), 75 DRGND (power), 76 DRVDD (power), 77 D5+ (out), 78 D6+ (out), 79 D7+ (out), 80 D8+ (out), 81 D9+ (out), 82 D10+ (out), 83 D11+ (out), 84 D12+ (out), 85 D13+ (out), 86 D14+ (out), 87 DRGND (power), 88 DRVDD (power), 89 D15+(MSB) (out), 90 OR+ (out), 91 AGND (power), 92 AVDD1 (power), 93 AVDD1 (power), 94 AVDD1 (power), 95 AVDD1 (power), 96 AVDD1 (power), 97 AVDD1 (power), 98 AGND (power), 99 AGND (power), 100 SFDR (in), 101 EP (power)
text: CMOS; MODE